# Altium footprint library 集大电协1.2.PcbLib: 197 footprints (part 10 of 13)
Each footprint in its own frame and in the unit in brackets; x right, y up, seen from the top. Pads: shape width x height; smd on the part's side, far side on the other; paste and mask are expansions set on the pad; w line width, h text height; cw(c..) or ccw(c..) is an arc to the next point about the centre after c.
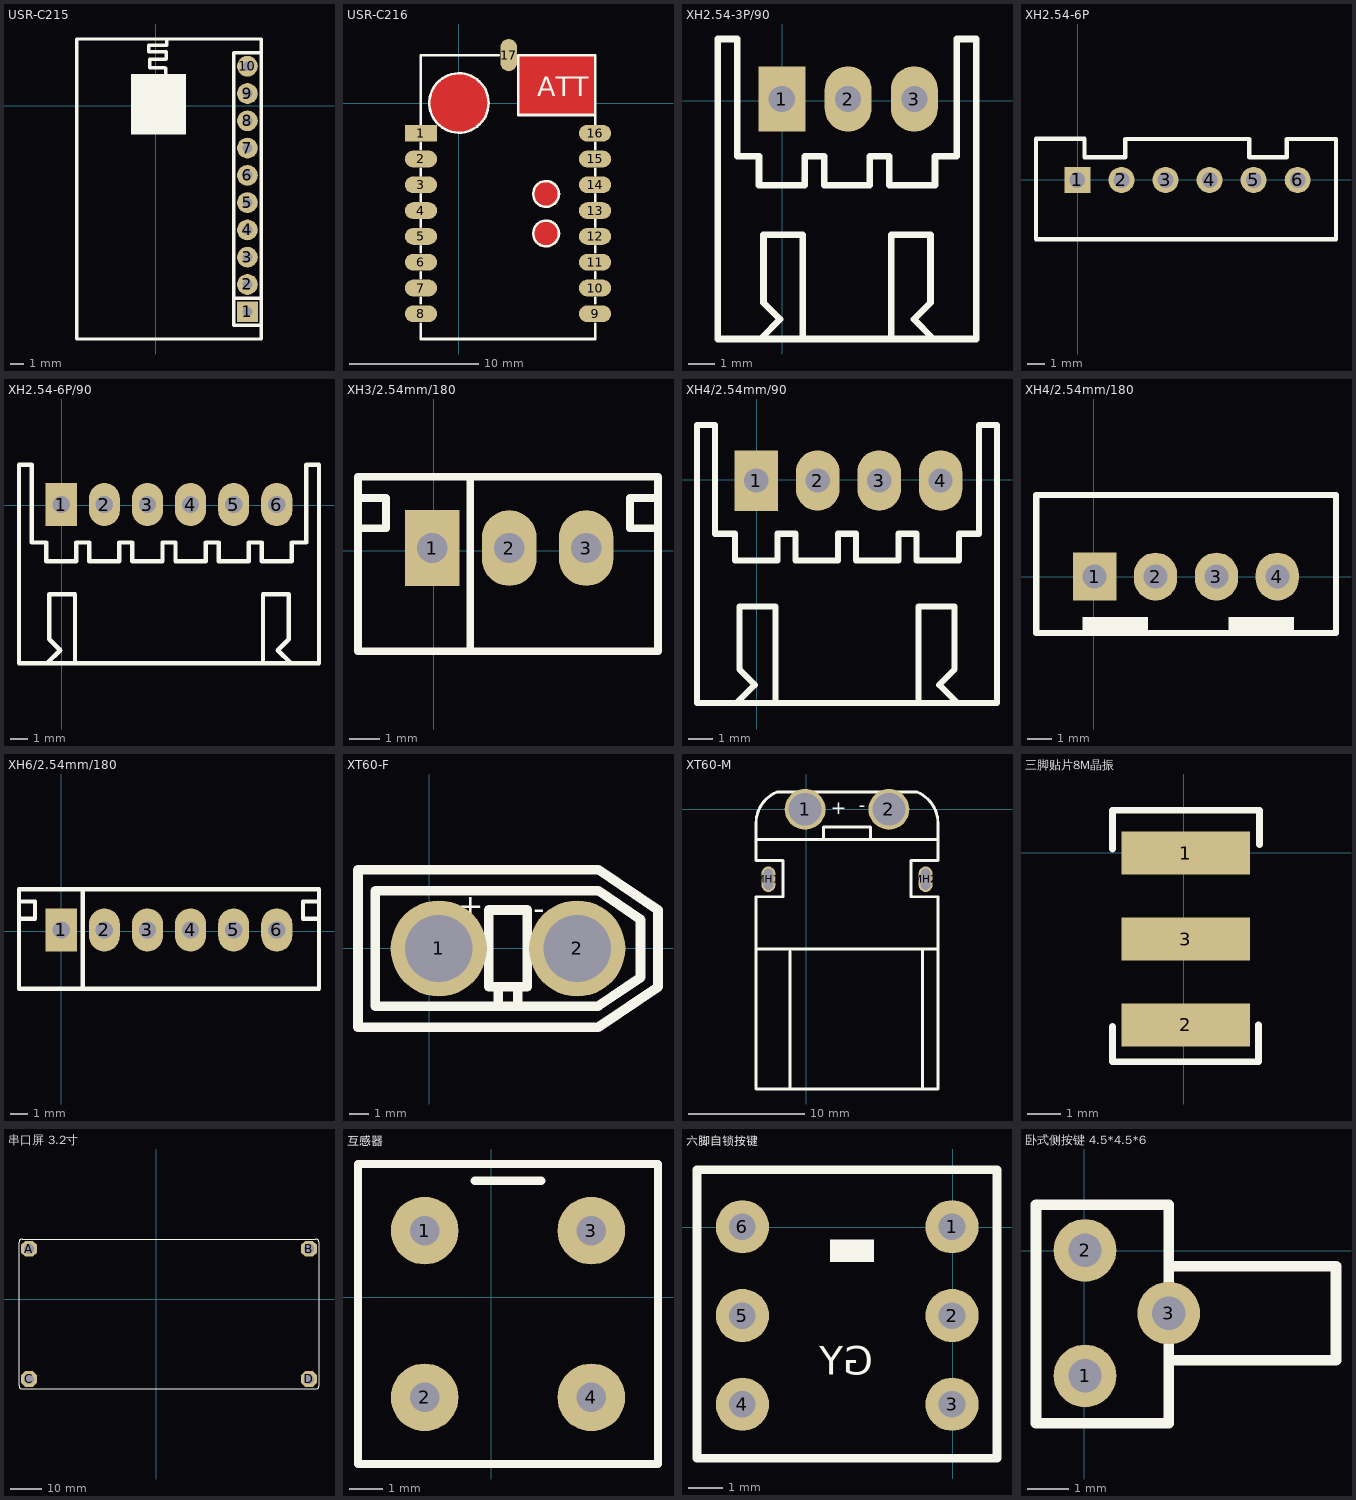
[diagram p9: the footprints below, top view; thin cyan lines are the x and y axes]

## USR-C215 [mil]
pads (10):
  rect 60x60 hole 28: 1(264.14,-593.99)
  round 60 hole 28: 2(264.14,-515.25) 3(264.14,-436.51) 4(264.14,-357.77) 5(264.14,-279.03) 6(264.14,-200.29) 7(264.14,-121.55) 8(264.14,-42.81) 9(264.14,35.93) 10(264.14,114.67)
Top Overlay:
  circle w10: c16.75,46.74 r32.8
  rectangle: -71.86,-81.99 86.14,92.01
  lines w10: 27.75,80.74 27.75,108.74 25.75,110.74 -18.25,110.74 -18.25,134.74 28.75,134.74 29.75,135.74 29.75,156.74 -20.25,156.74 -20.25,174.74 31.75,174.74 31.75,190.74 ; 224.77,-554.62 303.51,-554.62 ; -227.99,-672.73 -227.99,193.41 303.51,193.41 303.51,-672.73 -227.99,-672.73 ; 224.77,-633.36 224.77,154.04 303.51,154.04 303.51,-633.36 224.77,-633.36
3D body: height 30, standoff 0, extent -227,-672 303,193
3D body: height 40, standoff 30, extent -72,-83 85,90
3D body: height 40, standoff 10, extent -22.25,9.74 53.75,84.74

## USR-C216 [mm] "有人公司WIFI模组 USR-C216"
pads (17):
  rect 2.5x1.3 smd: 1(-2.945,-2.325)
  oval 2.5x1.3 smd: 2(-2.945,-4.325) 3(-2.945,-6.325) 4(-2.945,-8.325) 5(-2.945,-10.325) 6(-2.945,-12.325) 7(-2.945,-14.325) 8(-2.945,-16.325) 9(10.555,-16.325) 10(10.555,-14.325) 11(10.555,-12.325) 12(10.555,-10.325) 13(10.555,-8.325) 14(10.555,-6.325) 15(10.555,-4.325) 16(10.555,-2.325)
  oval 1.3x2.5 smd: 17(3.855,3.725)
Top Layer:
  pour cut-out: 0.015,2.305 0.241,2.305 0.683,2.217 1.1,2.044 1.475,1.794 1.794,1.475 2.044,1.1 2.217,0.683 2.305,0.241 2.305,0.015 2.305,-0.212 2.217,-0.656 2.043,-1.074 1.792,-1.451 1.471,-1.772 1.094,-2.023 0.676,-2.197 0.232,-2.285 0.005,-2.285 -0.015,-2.285 -0.241,-2.285 -0.683,-2.197 -1.1,-2.024 -1.475,-1.774 -1.794,-1.455 -2.044,-1.08 -2.217,-0.663 -2.305,-0.221 -2.305,0.005 -2.305,0.025 -2.305,0.25 -2.217,0.69 -2.046,1.105 -1.796,1.478 -1.478,1.796 -1.105,2.046 -0.69,2.217 -0.25,2.305 -0.025,2.305
  pour cut-out: 4.611,3.725 4.611,-0.905 10.555,-0.905 10.555,3.725
  pour cut-out: 6.755,-6.035 6.853,-6.035 7.047,-6.073 7.229,-6.149 7.392,-6.258 7.532,-6.398 7.641,-6.561 7.717,-6.743 7.755,-6.937 7.755,-7.035 7.755,-7.133 7.717,-7.327 7.641,-7.509 7.532,-7.672 7.392,-7.812 7.229,-7.921 7.047,-7.997 6.853,-8.035 6.755,-8.035 6.657,-8.035 6.463,-7.997 6.281,-7.921 6.118,-7.812 5.978,-7.672 5.869,-7.509 5.793,-7.327 5.755,-7.133 5.755,-7.035 5.755,-7.025 5.755,-6.927 5.793,-6.736 5.868,-6.556 5.976,-6.394 6.114,-6.256 6.276,-6.148 6.456,-6.073 6.647,-6.035 6.745,-6.035
  pour cut-out: 6.755,-9.085 6.853,-9.085 7.047,-9.123 7.229,-9.199 7.392,-9.308 7.532,-9.448 7.641,-9.611 7.717,-9.793 7.755,-9.987 7.755,-10.085 7.755,-10.105 7.755,-10.203 7.717,-10.397 7.641,-10.579 7.532,-10.742 7.392,-10.882 7.229,-10.991 7.047,-11.067 6.853,-11.105 6.755,-11.105 6.657,-11.105 6.463,-11.067 6.281,-10.991 6.118,-10.882 5.978,-10.742 5.869,-10.579 5.793,-10.397 5.755,-10.203 5.755,-10.105 5.755,-10.085 5.755,-9.987 5.793,-9.793 5.869,-9.611 5.978,-9.448 6.118,-9.308 6.281,-9.199 6.463,-9.123 6.657,-9.085
Top Overlay:
  circle w0.2: c0.005,0.015 r2.3
  circle w0.2: c6.755,-10.095 r1
  circle w0.2: c6.755,-7.035 r1
  lines w0.203: -2.945,-17.081 -2.945,-18.275 10.555,-18.275 10.555,-17.081 ; -2.945,-15.506 -2.945,-15.075 ; -2.945,-13.576 -2.945,-13.093 ; -2.945,-11.544 -2.945,-11.087 ; -2.945,-9.588 -2.945,-9.055 ; -2.945,-7.582 -2.945,-7.074 ; -2.945,-5.6 -2.945,-5.067 ; -2.945,-3.568 -2.945,-3.086 ; -2.945,-1.638 -2.945,3.725 3.087,3.725 ; 10.555,-15.506 10.555,-15.075 ; 10.555,-13.576 10.555,-13.093 ; 10.555,-11.544 10.555,-11.087 ; 10.555,-9.588 10.555,-9.055 ; 10.555,-7.582 10.555,-7.074 ; 10.555,-5.6 10.555,-5.067 ; 10.555,-3.568 10.555,-3.086 ; 10.555,-1.638 10.555,3.725 4.611,3.725 4.611,-0.915 10.555,-0.915
  text "ATT" at 6.059,0.525 h1.52
3D body: height 1, standoff 0, extent -3.035,-18.185 10.535,3.725

## XH2.54-3P/90 [mm]
pads (3):
  rect 1.8x2.5 hole 1: 1(-0.02,0.065)
  oval 1.8x2.5 hole 1: 2(2.52,0.065) 3(5.06,0.065)
Top Overlay:
  lines w0.254: -0.81,-9.107 -0.083,-8.381 -0.72,-7.744 -0.72,-5.135 0.78,-5.135 0.78,-9.135 ; 4.18,-9.135 4.18,-5.135 5.68,-5.135 5.68,-7.744 5.044,-8.381 5.77,-9.107 ; -2.47,-9.135 7.43,-9.135 7.43,2.365 6.68,2.365 6.68,-2.135 5.855,-2.135 5.855,-3.235 4.105,-3.235 4.105,-2.135 3.355,-2.135 3.355,-3.235 1.605,-3.235 1.605,-2.135 0.855,-2.135 0.855,-3.235 -0.895,-3.235 -0.895,-2.135 -1.72,-2.135 -1.72,2.365 -2.47,2.365 -2.47,-9.135
3D body "JST-S3B-XH-A.STEP": height 6.1, standoff -3.4, extent -2.47,-9.135 7.43,2.365

## XH2.54-6P [mm]
pads (6):
  rect 1.5x1.5 hole 0.9: 1(-0.018,-0.022)
  round 1.5 hole 0.9: 2(2.522,-0.022) 3(5.062,-0.022) 4(7.602,-0.022) 5(10.142,-0.022) 6(12.682,-0.022)
Top Overlay:
  lines w0.254: -2.406,-3.451 -2.406,2.366 0.388,2.366 0.388,1.299 2.75,1.299 2.75,2.34 9.888,2.34 9.888,1.299 12.047,1.299 12.047,2.34 14.891,2.34 14.891,-3.451 -2.406,-3.451
3D body "6pin-2.5.step": height 7, standoff -3.4, extent -2.495,-3.405 14.905,2.345

## XH2.54-6P/90 [mm]
pads (6):
  rect 1.8x2.5 hole 1: 1(-0.015,0.035)
  oval 1.8x2.5 hole 1: 2(2.485,0.035) 3(4.985,0.035) 4(7.485,0.035) 5(9.985,0.035) 6(12.485,0.035)
Top Overlay:
  lines w0.254: -0.805,-9.137 -0.079,-8.41 -0.715,-7.774 -0.715,-5.165 0.785,-5.165 0.785,-9.165 ; 11.685,-9.165 11.685,-5.165 13.185,-5.165 13.185,-7.774 12.548,-8.41 13.275,-9.137 ; -2.465,-9.165 14.935,-9.165 14.935,2.335 14.185,2.335 14.185,-2.165 13.36,-2.165 13.36,-3.265 11.61,-3.265 11.61,-2.165 10.86,-2.165 10.86,-3.265 9.11,-3.265 9.11,-2.165 8.36,-2.165 8.36,-3.265 6.61,-3.265 6.61,-2.165 5.86,-2.165 5.86,-3.265 4.11,-3.265 4.11,-2.165 3.36,-2.165 3.36,-3.265 1.61,-3.265 1.61,-2.165 0.86,-2.165 0.86,-3.265 -0.89,-3.265 -0.89,-2.165 -1.715,-2.165 -1.715,2.335 -2.465,2.335 -2.465,-9.165
3D body "JST-S6B-XH-A.STEP": height 6.1, standoff -3.4, extent -2.465,-9.165 14.935,2.335

## XH3/2.54mm/180 [mm]
pads (3):
  rect 1.8x2.5 hole 1: 1(-0.045,0.08)
  oval 1.8x2.5 hole 1: 2(2.495,0.08) 3(5.035,0.08)
Top Overlay:
  lines w0.254: -2.495,0.73 -1.569,0.73 -1.569,1.73 -2.495,1.73 ; 1.205,-3.32 1.205,2.43 ; 7.405,0.73 6.479,0.73 6.479,1.73 7.405,1.73 ; -2.495,-3.32 7.405,-3.32 7.405,2.43 -2.495,2.43 -2.495,-3.32
3D body "JST-B3B-XH-A.STEP": height 7, standoff -3.4, extent -2.495,-3.32 7.405,2.43

## XH4/2.54mm/90 [mm]
pads (4):
  rect 1.8x2.5 hole 1: 1(-0.015,-0.035)
  oval 1.8x2.5 hole 1: 2(2.525,-0.035) 3(5.065,-0.035) 4(7.605,-0.035)
Top Overlay:
  lines w0.254: -0.805,-9.207 -0.079,-8.481 -0.715,-7.844 -0.715,-5.235 0.785,-5.235 0.785,-9.235 ; 6.685,-9.235 6.685,-5.235 8.185,-5.235 8.185,-7.844 7.548,-8.481 8.275,-9.207 ; -2.465,-9.235 -2.465,2.265 -1.715,2.265 -1.715,-2.235 -0.89,-2.235 -0.89,-3.335 0.86,-3.335 0.86,-2.235 1.61,-2.235 1.61,-3.335 3.36,-3.335 3.36,-2.235 4.11,-2.235 4.11,-3.335 5.86,-3.335 5.86,-2.235 6.61,-2.235 6.61,-3.335 8.36,-3.335 8.36,-2.235 9.185,-2.235 9.185,2.265 9.935,2.265 9.935,-9.235 -2.465,-9.235
3D body "JST-S4B-XH-A.STEP": height 6.1, standoff -3.4, extent -2.465,-9.235 9.935,2.265

## XH4/2.54mm/180 [mm]
pads (4):
  rect 1.8x2 hole 1: 1(0.045,0.005)
  oval 1.8x2 hole 1: 2(2.585,0.005) 3(5.125,0.005) 4(7.665,0.005)
Top Overlay:
  region: 2.273,-1.687 -0.463,-1.687 -0.463,-2.337 2.273,-2.337
  region: 8.369,-1.687 5.633,-1.687 5.633,-2.337 8.369,-2.337
  lines w0.24: 10.115,-2.345 10.115,0.005
  lines w0.254: -2.393,-2.32 -2.393,3.405 ; 10.115,0.005 10.115,3.405 ; -2.405,-2.345 10.115,-2.345 ; -2.405,-2.345 -2.405,3.405 ; -2.405,-2.345 -2.405,0.005 -2.405,3.405 ; -2.405,3.405 10.115,3.405 ; 10.115,-2.345 10.115,-2.345 ; 10.115,-2.345 10.115,3.405
3D body "User Library-B4B-XH-A.STEP": height 7, standoff -3.4, extent -2.345,-2.443 10.055,3.307

## XH6/2.54mm/180 [mm]
pads (6):
  rect 1.8x2.5 hole 1: 1(0.01,0.08)
  oval 1.8x2.5 hole 1: 2(2.51,0.08) 3(5.01,0.08) 4(7.51,0.08) 5(10.01,0.08) 6(12.51,0.08)
Top Overlay:
  lines w0.254: -2.44,0.73 -1.514,0.73 -1.514,1.73 -2.44,1.73 ; 1.26,-3.32 1.26,2.43 ; 14.96,0.73 14.034,0.73 14.034,1.73 14.96,1.73 ; -2.44,-3.32 14.96,-3.32 14.96,2.43 -2.44,2.43 -2.44,-3.32
3D body "JST-B6B-XH-A.STEP": height 7, standoff -3.4, extent -2.44,-3.32 14.96,2.43

## XT60-F [mm]
pads (2):
  round 5 hole 3.5: 1(0.489,0) 2(7.689,0)
Top Overlay:
  lines w0.5: 3.048,-3 -2.819,-3 ; 3.589,-3 3.589,-2 4.589,-2 4.589,-3 ; 5.089,-3 8.791,-3 -2.819,-3 ; 8.791,-3.001 10.982,-1.5 10.982,1.5 8.791,3.001 -2.819,3 -2.819,-3 ; -3.711,-4.1 8.788,-4.1 11.889,-2 11.889,2 8.788,4.1 -3.711,4.1 -3.711,-4.1 ; 3.089,-2 3.089,2 5.089,2 5.089,-2 3.089,-2
  text "+" at 2.819,3.048 h2.03
  text "-" at 5.994,2.794 h2.03
3D body "XT60H male.STEP": height 16.5, standoff -4.7, extent -3.81,-4.064 12.09,4.086

## XT60-M [mm]
pads (4):
  round 3.5 hole 2.8: 1(-0.095,0) 2(7.105,0)
  oval 1.2x2.2 hole 0.8 slot 1.8 at 90 deg: MH1(-3.245,-6) MH2(10.255,-6)
Top Overlay:
  lines w0.254: -4.297,-1.2 cw(c-1.405,-1.179) -2.495,1.5 ; -4.295,-2.6 11.305,-2.6 ; -4.295,-1.2 -4.295,-4.4 -1.995,-4.4 -1.995,-7.5 -4.295,-7.5 -4.295,-12 ; -1.395,-24 -1.395,-12.2 ; 1.505,-2.5 1.505,-1.5 5.505,-1.5 5.505,-2.5 ; 10.005,-24 10.005,-12 ; 11.305,-1.2 11.305,-4.4 9.005,-4.4 9.005,-7.5 11.305,-7.5 11.305,-12 ; 11.308,-1.2 ccw(c8.416,-1.179) 9.505,1.5 ; -4.295,-24 11.305,-24 ; -4.295,-24 -4.295,-12 ; -4.295,-24 11.305,-24 ; -4.295,-12 4.905,-12 11.305,-12 ; -2.495,1.5 9.505,1.5 ; -2.495,1.5 9.505,1.5 ; 11.305,-24 11.305,-12
  text "+" at 2.105,-0.8 h2.03
  text "-" at 4.505,-0.6 h2.03
3D body "User Library-XT60PW 3D DRAWING-1.STEP": height 4.1, standoff -6.4, extent -4.267,-40.304 11.633,1.524

## 三脚贴片8M晶振 [mm] "CSTCC8M00G53-RO"
pads (3):
  rect 3.8x1.27 smd: 1(0.06,-0.006) 2(0.06,-5.086) 3(0.06,-2.546)
Top Overlay:
  lines w0.203: -2.099,-5.137 -2.099,-6.178 2.219,-6.178 2.219,-5.086 ; -2.099,0.121 -2.099,1.264 2.244,1.264 2.244,0.248
3D body: height 1.5, standoff 0.1, extent -1.718,-6.229 1.838,1.264

## 串口屏 3.2寸 [mm]
pads (4):
  oct 5x5 hole 3.2: A(-40.3,15.9) B(48.3,15.9) C(-40.3,-25.3) D(48.3,-25.3)
Top Overlay:
  lines w0.127: -43.5,-27.5 ccw(c-42.5,-27.5) -42.5,-28.5 50.5,-28.5 ccw(c50.5,-27.5) 51.5,-27.5 51.5,18 ccw(c50.5,18) 50.5,19 -42.5,19 ccw(c-42.5,18) -43.5,18 -43.5,-27.5

## 互感器 [mil]
pads (4):
  round 80 hole 35: 1(-78.74,78.74) 2(-78.74,-118.11) 3(118.11,78.74) 4(118.11,-118.11)
Top Overlay:
  lines w10: -19.68,137.8 59.06,137.8 ; -157.48,-196.85 196.85,-196.85 196.85,157.48 -157.48,157.48 -157.48,-196.85

## 六脚自锁按键 [mil]
pads (6):
  round 60 hole 30: 1(-0.63,0.71) 2(-0.63,-99.29) 3(-0.63,-199.29) 4(-236.85,-199.29) 5(-236.85,-99.29) 6(-236.85,0.71)
Top Overlay:
  region: -88.43,-13.66 -138.43,-13.66 -138.43,-38.66 -88.43,-38.66
  lines w10: -288,-260 50,-260 50,65 -288,65 -288,-260
  text "GY" at -89.21,-176.46 h55
3D body "TL 2201.step": height 551.18, standoff -137.8, extent -287.32,-266 47.32,68.64

## 卧式侧按键 4.5*4.5*6 [mm] "卧式侧按键 4.5*4.5*6"
pads (3):
  round 1.5 hole 0.8: 1(0.022,-2.992) 2(0.022,0.008) 3(2.022,-1.492)
Top Overlay:
  lines w0.254: 2.022,-2.617 6.022,-2.617 6.022,-0.367 2.022,-0.367 ; -1.15,-4.125 -1.15,1.1 2.022,1.1 2.022,-4.125 -1.15,-4.125